# Altium footprint library PCB_IntegratedCircuit.PcbLib: 56 footprints (part 2 of 4)
Each footprint in its own frame and in the unit in brackets; x right, y up, seen from the top. Pads: shape width x height; smd on the part's side, far side on the other; paste and mask are expansions set on the pad; w line width, h text height; cw(c..) or ccw(c..) is an arc to the next point about the centre after c.
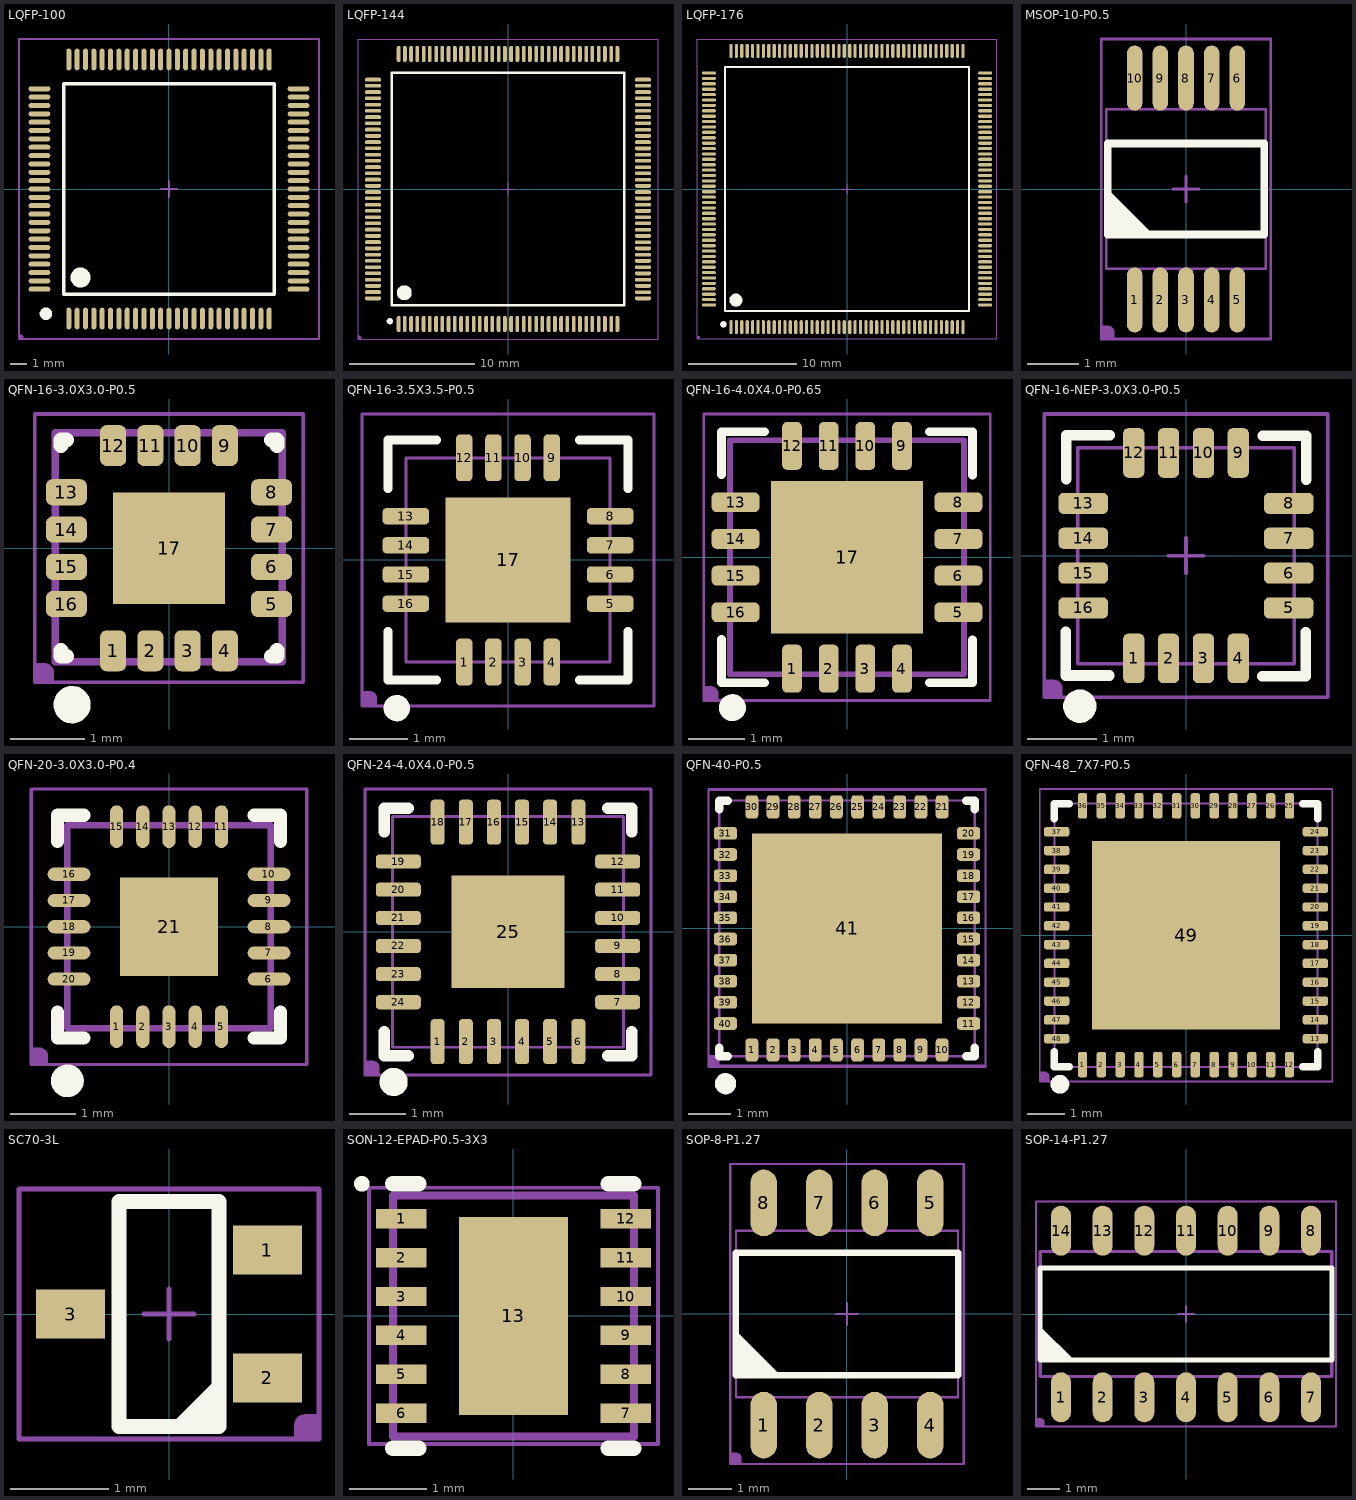
[diagram p1: the footprints below, top view; thin cyan lines are the x and y axes]

## LQFP-100 [mm]
height 1.6
pads (100):
  oval 0.3x1.3 smd: 1(-6,-7.754) 2(-5.5,-7.754) 3(-5,-7.754) 4(-4.5,-7.754) 5(-4,-7.754) 6(-3.5,-7.754) 7(-3,-7.754) 8(-2.5,-7.754) 9(-2,-7.754) 10(-1.5,-7.754) 11(-1,-7.754) 12(-0.5,-7.754) 13(0,-7.754) 14(0.5,-7.754) 15(1,-7.754) 16(1.5,-7.754) 17(2,-7.754) 18(2.5,-7.754) 19(3,-7.754) 20(3.5,-7.754) 21(4,-7.754) 22(4.5,-7.754) 23(5,-7.754) 24(5.5,-7.754) 25(6,-7.754) 51(6,7.754) 52(5.5,7.754) 53(5,7.754) 54(4.5,7.754) 55(4,7.754) 56(3.5,7.754) 57(3,7.754) 58(2.5,7.754) 59(2,7.754) 60(1.5,7.754) 61(1,7.754) 62(0.5,7.754) 63(0,7.754) 64(-0.5,7.754) 65(-1,7.754) 66(-1.5,7.754) 67(-2,7.754) 68(-2.5,7.754) 69(-3,7.754) 70(-3.5,7.754) 71(-4,7.754) 72(-4.5,7.754) 73(-5,7.754) 74(-5.5,7.754) 75(-6,7.754)
  oval 1.3x0.3 smd: 26(7.754,-6) 27(7.754,-5.5) 28(7.754,-5) 29(7.754,-4.5) 30(7.754,-4) 31(7.754,-3.5) 32(7.754,-3) 33(7.754,-2.5) 34(7.754,-2) 35(7.754,-1.5) 36(7.754,-1) 37(7.754,-0.5) 38(7.754,0) 39(7.754,0.5) 40(7.754,1) 41(7.754,1.5) 42(7.754,2) 43(7.754,2.5) 44(7.754,3) 45(7.754,3.5) 46(7.754,4) 47(7.754,4.5) 48(7.754,5) 49(7.754,5.5) 50(7.754,6) 76(-7.754,6) 77(-7.754,5.5) 78(-7.754,5) 79(-7.754,4.5) 80(-7.754,4) 81(-7.754,3.5) 82(-7.754,3) 83(-7.754,2.5) 84(-7.754,2) 85(-7.754,1.5) 86(-7.754,1) 87(-7.754,0.5) 88(-7.754,0) 89(-7.754,-0.5) 90(-7.754,-1) 91(-7.754,-1.5) 92(-7.754,-2) 93(-7.754,-2.5) 94(-7.754,-3) 95(-7.754,-3.5) 96(-7.754,-4) 97(-7.754,-4.5) 98(-7.754,-5) 99(-7.754,-5.5) 100(-7.754,-6)
Top Overlay:
  circle w0.5: c-7.364,-7.468 r0.125
  circle w0.6: c-5.3,-5.3 r0.3
  lines w0.2: -6.3,-6.3 6.3,-6.3 6.3,6.3 -6.3,6.3 -6.3,-6.3
Top Assembly (Mech13):
  lines w0.1: -0.5,0 0.5,0 ; 0,-0.5 0,0.5
Top Component:
  region: -8.979,-8.979 -8.979,-8.725 -8.852,-8.725 -8.827,-8.725 -8.78,-8.745 -8.745,-8.78 -8.725,-8.827 -8.725,-8.852 -8.725,-8.979
  lines w0.1: -8.979,-8.979 -8.979,8.979 8.979,8.979 8.979,-8.979 -8.979,-8.979
  text ".Designator" at -1.041,-0.61 h2.54
3D body "LQFP_100.STEP": height 1.72, standoff -0.03, extent -7.998,-7.999 7.999,7.999

## LQFP-144 [mm]
height 1.6
pads (144):
  oval 0.3x1.3 smd: 1(-8.75,-10.8) 2(-8.25,-10.8) 3(-7.75,-10.8) 4(-7.25,-10.8) 5(-6.75,-10.8) 6(-6.25,-10.8) 7(-5.75,-10.8) 8(-5.25,-10.8) 9(-4.75,-10.8) 10(-4.25,-10.8) 11(-3.75,-10.8) 12(-3.25,-10.8) 13(-2.75,-10.8) 14(-2.25,-10.8) 15(-1.75,-10.8) 16(-1.25,-10.8) 17(-0.75,-10.8) 18(-0.25,-10.8) 19(0.25,-10.8) 20(0.75,-10.8) 21(1.25,-10.8) 22(1.75,-10.8) 23(2.25,-10.8) 24(2.75,-10.8) 25(3.25,-10.8) 26(3.75,-10.8) 27(4.25,-10.8) 28(4.75,-10.8) 29(5.25,-10.8) 30(5.75,-10.8) 31(6.25,-10.8) 32(6.75,-10.8) 33(7.25,-10.8) 34(7.75,-10.8) 35(8.25,-10.8) 36(8.75,-10.8) 73(8.75,10.8) 74(8.25,10.8) 75(7.75,10.8) 76(7.25,10.8) 77(6.75,10.8) 78(6.25,10.8) 79(5.75,10.8) 80(5.25,10.8) 81(4.75,10.8) 82(4.25,10.8) 83(3.75,10.8) 84(3.25,10.8) 85(2.75,10.8) 86(2.25,10.8) 87(1.75,10.8) 88(1.25,10.8) 89(0.75,10.8) 90(0.25,10.8) 91(-0.25,10.8) 92(-0.75,10.8) 93(-1.25,10.8) 94(-1.75,10.8) 95(-2.25,10.8) 96(-2.75,10.8) 97(-3.25,10.8) 98(-3.75,10.8) 99(-4.25,10.8) 100(-4.75,10.8) 101(-5.25,10.8) 102(-5.75,10.8) 103(-6.25,10.8) 104(-6.75,10.8) 105(-7.25,10.8) 106(-7.75,10.8) 107(-8.25,10.8) 108(-8.75,10.8)
  oval 1.3x0.3 smd: 37(10.8,-8.75) 38(10.8,-8.25) 39(10.8,-7.75) 40(10.8,-7.25) 41(10.8,-6.75) 42(10.8,-6.25) 43(10.8,-5.75) 44(10.8,-5.25) 45(10.8,-4.75) 46(10.8,-4.25) 47(10.8,-3.75) 48(10.8,-3.25) 49(10.8,-2.75) 50(10.8,-2.25) 51(10.8,-1.75) 52(10.8,-1.25) 53(10.8,-0.75) 54(10.8,-0.25) 55(10.8,0.25) 56(10.8,0.75) 57(10.8,1.25) 58(10.8,1.75) 59(10.8,2.25) 60(10.8,2.75) 61(10.8,3.25) 62(10.8,3.75) 63(10.8,4.25) 64(10.8,4.75) 65(10.8,5.25) 66(10.8,5.75) 67(10.8,6.25) 68(10.8,6.75) 69(10.8,7.25) 70(10.8,7.75) 71(10.8,8.25) 72(10.8,8.75) 109(-10.8,8.75) 110(-10.8,8.25) 111(-10.8,7.75) 112(-10.8,7.25) 113(-10.8,6.75) 114(-10.8,6.25) 115(-10.8,5.75) 116(-10.8,5.25) 117(-10.8,4.75) 118(-10.8,4.25) 119(-10.8,3.75) 120(-10.8,3.25) 121(-10.8,2.75) 122(-10.8,2.25) 123(-10.8,1.75) 124(-10.8,1.25) 125(-10.8,0.75) 126(-10.8,0.25) 127(-10.8,-0.25) 128(-10.8,-0.75) 129(-10.8,-1.25) 130(-10.8,-1.75) 131(-10.8,-2.25) 132(-10.8,-2.75) 133(-10.8,-3.25) 134(-10.8,-3.75) 135(-10.8,-4.25) 136(-10.8,-4.75) 137(-10.8,-5.25) 138(-10.8,-5.75) 139(-10.8,-6.25) 140(-10.8,-6.75) 141(-10.8,-7.25) 142(-10.8,-7.75) 143(-10.8,-8.25) 144(-10.8,-8.75)
Top Overlay:
  circle w0.6: c-8.3,-8.3 r0.3
  circle w0.25: c-9.45,-10.575 r0.13
  lines w0.2: -9.3,-9.3 -9.3,9.3 9.3,9.3 9.3,-9.3 -9.3,-9.3
Top Assembly (Mech13):
  lines w0.1: -0.5,0 0.5,0 ; 0,-0.5 0,0.5
Top Component:
  region: -12,-12 -12,-11.746 -11.873,-11.746 -11.848,-11.746 -11.801,-11.765 -11.765,-11.801 -11.746,-11.848 -11.746,-11.873 -11.746,-12
  lines w0.1: -12,-12 12,-12 12,12 -12,12 -12,-12
  text ".Designator" at -1.041,-0.61 h2.54
3D body "LQFP_144.STEP": height 1.55, standoff 0, extent -11.003,-11.003 11.003,11.003

## LQFP-176 [mm]
height 1.6
pads (176):
  oval 0.3x1.3 smd: 1(-10.75,-12.804) 2(-10.25,-12.804) 3(-9.75,-12.804) 4(-9.25,-12.804) 5(-8.75,-12.804) 6(-8.25,-12.804) 7(-7.75,-12.804) 8(-7.25,-12.804) 9(-6.75,-12.804) 10(-6.25,-12.804) 11(-5.75,-12.804) 12(-5.25,-12.804) 13(-4.75,-12.804) 14(-4.25,-12.804) 15(-3.75,-12.804) 16(-3.25,-12.804) 17(-2.75,-12.804) 18(-2.25,-12.804) 19(-1.75,-12.804) 20(-1.25,-12.804) 21(-0.75,-12.804) 22(-0.25,-12.804) 23(0.25,-12.804) 24(0.75,-12.804) 25(1.25,-12.804) 26(1.75,-12.804) 27(2.25,-12.804) 28(2.75,-12.804) 29(3.25,-12.804) 30(3.75,-12.804) 31(4.25,-12.804) 32(4.75,-12.804) 33(5.25,-12.804) 34(5.75,-12.804) 35(6.25,-12.804) 36(6.75,-12.804) 37(7.25,-12.804) 38(7.75,-12.804) 39(8.25,-12.804) 40(8.75,-12.804) 41(9.25,-12.804) 42(9.75,-12.804) 43(10.25,-12.804) 44(10.75,-12.804) 89(10.75,12.804) 90(10.25,12.804) 91(9.75,12.804) 92(9.25,12.804) 93(8.75,12.804) 94(8.25,12.804) 95(7.75,12.804) 96(7.25,12.804) 97(6.75,12.804) 98(6.25,12.804) 99(5.75,12.804) 100(5.25,12.804) 101(4.75,12.804) 102(4.25,12.804) 103(3.75,12.804) 104(3.25,12.804) 105(2.75,12.804) 106(2.25,12.804) 107(1.75,12.804) 108(1.25,12.804) 109(0.75,12.804) 110(0.25,12.804) 111(-0.25,12.804) 112(-0.75,12.804) 113(-1.25,12.804) 114(-1.75,12.804) 115(-2.25,12.804) 116(-2.75,12.804) 117(-3.25,12.804) 118(-3.75,12.804) 119(-4.25,12.804) 120(-4.75,12.804) 121(-5.25,12.804) 122(-5.75,12.804) 123(-6.25,12.804) 124(-6.75,12.804) 125(-7.25,12.804) 126(-7.75,12.804) 127(-8.25,12.804) 128(-8.75,12.804) 129(-9.25,12.804) 130(-9.75,12.804) 131(-10.25,12.804) 132(-10.75,12.804)
  oval 1.3x0.3 smd: 45(12.804,-10.75) 46(12.804,-10.25) 47(12.804,-9.75) 48(12.804,-9.25) 49(12.804,-8.75) 50(12.804,-8.25) 51(12.804,-7.75) 52(12.804,-7.25) 53(12.804,-6.75) 54(12.804,-6.25) 55(12.804,-5.75) 56(12.804,-5.25) 57(12.804,-4.75) 58(12.804,-4.25) 59(12.804,-3.75) 60(12.804,-3.25) 61(12.804,-2.75) 62(12.804,-2.25) 63(12.804,-1.75) 64(12.804,-1.25) 65(12.804,-0.75) 66(12.804,-0.25) 67(12.804,0.25) 68(12.804,0.75) 69(12.804,1.25) 70(12.804,1.75) 71(12.804,2.25) 72(12.804,2.75) 73(12.804,3.25) 74(12.804,3.75) 75(12.804,4.25) 76(12.804,4.75) 77(12.804,5.25) 78(12.804,5.75) 79(12.804,6.25) 80(12.804,6.75) 81(12.804,7.25) 82(12.804,7.75) 83(12.804,8.25) 84(12.804,8.75) 85(12.804,9.25) 86(12.804,9.75) 87(12.804,10.25) 88(12.804,10.75) 133(-12.804,10.75) 134(-12.804,10.25) 135(-12.804,9.75) 136(-12.804,9.25) 137(-12.804,8.75) 138(-12.804,8.25) 139(-12.804,7.75) 140(-12.804,7.25) 141(-12.804,6.75) 142(-12.804,6.25) 143(-12.804,5.75) 144(-12.804,5.25) 145(-12.804,4.75) 146(-12.804,4.25) 147(-12.804,3.75) 148(-12.804,3.25) 149(-12.804,2.75) 150(-12.804,2.25) 151(-12.804,1.75) 152(-12.804,1.25) 153(-12.804,0.75) 154(-12.804,0.25) 155(-12.804,-0.25) 156(-12.804,-0.75) 157(-12.804,-1.25) 158(-12.804,-1.75) 159(-12.804,-2.25) 160(-12.804,-2.75) 161(-12.804,-3.25) 162(-12.804,-3.75) 163(-12.804,-4.25) 164(-12.804,-4.75) 165(-12.804,-5.25) 166(-12.804,-5.75) 167(-12.804,-6.25) 168(-12.804,-6.75) 169(-12.804,-7.25) 170(-12.804,-7.75) 171(-12.804,-8.25) 172(-12.804,-8.75) 173(-12.804,-9.25) 174(-12.804,-9.75) 175(-12.804,-10.25) 176(-12.804,-10.75)
Top Overlay:
  circle w0.6: c-10.3,-10.3 r0.3
  circle w0.3: c-11.45,-12.55 r0.15
  lines w0.2: -11.3,-11.3 -11.3,11.3 11.3,11.3 11.3,-11.3 -11.3,-11.3
Top Assembly (Mech13):
  lines w0.1: -0.5,0 0.5,0 ; 0,-0.5 0,0.5
Top Component:
  region: -13.904,-13.904 -13.904,-13.65 -13.777,-13.65 -13.752,-13.65 -13.705,-13.669 -13.669,-13.705 -13.65,-13.752 -13.65,-13.777 -13.65,-13.904
  lines w0.1: -13.904,-13.904 13.904,-13.904 13.904,13.904 -13.904,13.904 -13.904,-13.904
  text ".Designator" at -1.041,-0.61 h2.54
3D body "LQFP_176.STEP": height 1.5, standoff 0, extent -13.002,-13.002 13.003,13.003

## MSOP-10-P0.5 [mil]
height 43.31
pads (10):
  oval 12x50 smd: 1(-39.37,-85) 2(-19.69,-85) 3(0,-85) 4(19.68,-85) 5(39.37,-85) 6(39.37,85) 7(19.68,85) 8(0,85) 9(-19.69,85) 10(-39.37,85)
Top Overlay:
  region: -60,-35 -60,0 -25,-35
  lines w6: -60,-35 60,-35 60,35 -60,35 -60,-35
Top Assembly (Mech13):
  lines w2: -10,0 10,0 ; 0,-10 0,10 ; -61.02,-61.02 -61.02,61.02 61.02,61.02 61.02,-61.02 -61.02,-61.02
Top Component:
  region: -65,-115 -65,-105 -60,-105 -59.01,-105 -57.17,-105.76 -55.76,-107.17 -55,-109.01 -55,-110 -55,-115
  lines w2: -65,-115 65,-115 65,115 -65,115 -65,-115
  text ".Designator" at -41,-25 h100
3D body "User Library-msop-10.STEP": height 45.28, standoff 0, extent -59.06,-96.45 59.05,96.46

## QFN-16-3.0X3.0-P0.5 [mm] "PQFN, 16-Leads, Body 3.00x3.00mm, Pitch 0.50mm, Thermal Pad 1.50x1.50mm, IPC Medium Density"
height 0.8
pads (17):
  rrect50% 0.35x0.55 smd: 1(-0.75,-1.377) 2(-0.25,-1.377) 3(0.25,-1.377) 4(0.75,-1.377) 9(0.75,1.377) 10(0.25,1.377) 11(-0.25,1.377) 12(-0.75,1.377)
  rrect50% 0.55x0.35 smd: 5(1.377,-0.75) 6(1.377,-0.25) 7(1.377,0.25) 8(1.377,0.75) 13(-1.377,0.75) 14(-1.377,0.25) 15(-1.377,-0.25) 16(-1.377,-0.75)
  rect 1.5x1.5 smd: 17(0,0)
Top Overlay:
  circle w0.25: c-1.3,-2.1 r0.125
  lines w0.2: -1.45,-1.375 -1.45,-1.45 -1.375,-1.45 ; -1.45,1.375 -1.45,1.45 -1.375,1.45 ; 1.375,-1.45 1.45,-1.45 1.45,-1.375 ; 1.375,1.45 1.45,1.45 1.45,1.375
Top Assembly (Mech13):
  lines w0.1: -0.5,0 0.5,0 ; 0,-0.5 0,0.5 ; -1.524,-1.524 -1.524,1.549 1.521,1.549 1.521,-1.524 -1.524,-1.524
Top Component:
  region: -1.8,-1.8 -1.8,-1.546 -1.673,-1.546 -1.648,-1.546 -1.601,-1.565 -1.565,-1.601 -1.546,-1.648 -1.546,-1.673 -1.546,-1.8
  lines w0.05: -1.8,-1.8 1.8,-1.8 1.8,1.8 -1.8,1.8 -1.8,-1.8
  text ".Designator" at -0.813,-0.533 h2.03
3D body "ALSRobot-QFN16 3x3.STEP": height 0.9, standoff 0, extent -1.521,-1.524 1.521,1.518

## QFN-16-3.5X3.5-P0.5 [mm]
pads (17):
  rrect50% 0.28x0.8 smd: 1(-0.75,-1.75) 2(-0.25,-1.75) 3(0.25,-1.75) 4(0.75,-1.75) 9(0.75,1.75) 10(0.25,1.75) 11(-0.25,1.75) 12(-0.75,1.75)
  rrect50% 0.8x0.28 smd: 5(1.75,-0.75) 6(1.75,-0.25) 7(1.75,0.25) 8(1.75,0.75) 13(-1.75,0.75) 14(-1.75,0.25) 15(-1.75,-0.25) 16(-1.75,-0.75)
  rect 2.14x2.14 smd: 17(0,0)
Top Overlay:
  circle w0.25: c-1.905,-2.54 r0.1
  lines w0.152: -2.057,-1.223 -2.057,-2.057 -1.223,-2.057 ; -2.057,1.223 -2.057,2.057 -1.223,2.057 ; 1.223,-2.057 2.057,-2.057 2.057,-1.223 ; 1.223,2.057 2.057,2.057 2.057,1.223
Top Assembly (Mech13):
  lines w0.051: -0.127,0 0.127,0 ; 0,-0.127 0,0.127 ; -1.75,-1.75 -1.75,1.75 1.75,1.75 1.75,-1.75 -1.75,-1.75
Top Component:
  region: -2.5,-2.5 -2.5,-2.246 -2.373,-2.246 -2.348,-2.246 -2.301,-2.265 -2.265,-2.301 -2.246,-2.348 -2.246,-2.373 -2.246,-2.5
  lines w0.051: -2.5,-2.5 -2.5,2.5 2.5,2.5 2.5,-2.5 -2.5,-2.5
  text ".Designator" at -1.041,-0.508 h2.03
3D body "RVA0016A.stp": height 1, standoff 0, extent -1.75,-1.75 1.75,1.75

## QFN-16-4.0X4.0-P0.65 [mm]
height 1.5
pads (17):
  rrect50% 0.35x0.85 smd: 1(-0.975,-1.975) 2(-0.325,-1.975) 3(0.325,-1.975) 4(0.975,-1.975) 9(0.975,1.975) 10(0.325,1.975) 11(-0.325,1.975) 12(-0.975,1.975)
  rrect50% 0.85x0.35 smd: 5(1.975,-0.975) 6(1.975,-0.325) 7(1.975,0.325) 8(1.975,0.975) 13(-1.975,0.975) 14(-1.975,0.325) 15(-1.975,-0.325) 16(-1.975,-0.975)
  rect 2.7x2.7 smd: 17(0,0)
Top Overlay:
  circle w0.254: c-2.032,-2.667 r0.112
  lines w0.152: -2.225,-1.458 -2.225,-2.225 -1.463,-2.225 ; -2.225,1.463 -2.225,2.225 -1.458,2.225 ; 1.458,-2.225 2.225,-2.225 2.225,-1.463 ; 1.463,2.225 2.225,2.225 2.225,1.458
Top Assembly (Mech13):
  lines w0.051: -0.254,0 0.254,0 ; 0,-0.254 0,0.254
  lines w0.1: -2.075,-2.075 -2.075,2.075 2.075,2.075 2.075,-2.075 -2.075,-2.075
Top Component:
  region: -2.54,-2.54 -2.54,-2.286 -2.413,-2.286 -2.388,-2.286 -2.341,-2.305 -2.305,-2.341 -2.286,-2.388 -2.286,-2.413 -2.286,-2.54
  lines w0.051: -2.54,-2.54 -2.54,2.54 2.54,2.54 2.54,-2.54 -2.54,-2.54
  text ".Designator" at -1.041,-0.635 h2.54
3D body "User Library-qfn16-4x4with pad.STEP": height 0.92, standoff 0, extent -2,-2 2,2

## QFN-16-NEP-3.0X3.0-P0.5 [mil]
height 23.62
pads (16):
  rrect50% 12x28 smd: 1(-29.53,-58) 2(-9.84,-58) 3(9.84,-58) 4(29.53,-58) 9(29.53,58) 10(9.84,58) 11(-9.84,58) 12(-29.53,58)
  rrect50% 28x12 smd: 5(58,-29.53) 6(58,-9.84) 7(58,9.84) 8(58,29.53) 13(-58,29.53) 14(-58,9.84) 15(-58,-9.84) 16(-58,-29.53)
Top Overlay:
  circle w10: c-60,-85 r4.4
  lines w6: -68,-43 -68,-67.67 -43.33,-67.67 ; -67.67,43.33 -67.67,68 -43,68 ; 43,-68 67.67,-68 67.67,-43.33 ; 43.33,67.67 68,67.67 68,43
Top Assembly (Mech13):
  lines w2: -10,0 10,0 ; 0,-10 0,10 ; -61.02,-61.02 61.02,-61.02 61.02,61.02 -61.02,61.02 -61.02,-61.02
Top Component:
  region: -80,-80 -80,-70 -75,-70 -74.01,-70 -72.17,-70.76 -70.76,-72.17 -70,-74.01 -70,-75 -70,-80
  lines w2: -80,-80 -80,80 80,80 80,-80 -80,-80
  text ".Designator" at -41,-20 h80
3D body "QFN50P300X300X100-16N.step": height 39.37, standoff 0, extent -59.06,-59.05 59.05,59.06

## QFN-20-3.0X3.0-P0.4 [mm] "QFN, 20-Leads, Body 3.00x3.00mm, Pitch 0.40mm, Thermal Pad 1.50x1.50mm, IPC Medium Density"
height 0.8
pads (21):
  oval 0.2x0.65 smd: 1(-0.8,-1.525) 2(-0.4,-1.525) 3(0,-1.525) 4(0.4,-1.525) 5(0.8,-1.525) 11(0.8,1.525) 12(0.4,1.525) 13(0,1.525) 14(-0.4,1.525) 15(-0.8,1.525)
  oval 0.65x0.2 smd: 6(1.525,-0.8) 7(1.525,-0.4) 8(1.525,0) 9(1.525,0.4) 10(1.525,0.8) 16(-1.525,0.8) 17(-1.525,0.4) 18(-1.525,0) 19(-1.525,-0.4) 20(-1.525,-0.8)
  rect 1.5x1.5 smd: 21(0,0)
Top Overlay:
  circle w0.25: c-1.55,-2.35 r0.125
  lines w0.2: -1.7,-1.3 -1.7,-1.7 -1.3,-1.7 ; -1.7,1.3 -1.7,1.7 -1.3,1.7 ; 1.3,-1.7 1.7,-1.7 1.7,-1.3 ; 1.3,1.7 1.7,1.7 1.7,1.3
Top Assembly (Mech13):
  lines w0.051: -0.254,0 0.254,0 ; 0,-0.254 0,0.254
  lines w0.1: -1.55,-1.55 -1.55,1.55 1.55,1.55 1.55,-1.55 -1.55,-1.55
Top Component:
  region: -2.1,-2.1 -2.1,-1.846 -1.973,-1.846 -1.948,-1.846 -1.901,-1.865 -1.865,-1.901 -1.846,-1.948 -1.846,-1.973 -1.846,-2.1
  lines w0.05: -2.1,-2.1 -2.1,2.1 2.1,2.1 2.1,-2.1 -2.1,-2.1
  text ".Designator" at -1.041,-0.508 h2.03
3D body: height 0.8, standoff 0, extent -1.55,-1.55 1.55,1.55

## QFN-24-4.0X4.0-P0.5 [mm] "QFN, 24-Leads, Body 4.00x4.00mm, Pitch 0.50mm, Thermal Pad 2.70x2.60mm, IPC Medium Density"
height 0.9
pads (25):
  rrect50% 0.25x0.8 smd: 1(-1.25,-1.95) 2(-0.75,-1.95) 3(-0.25,-1.95) 4(0.25,-1.95) 5(0.75,-1.95) 6(1.25,-1.95) 13(1.25,1.95) 14(0.75,1.95) 15(0.25,1.95) 16(-0.25,1.95) 17(-0.75,1.95) 18(-1.25,1.95)
  rrect50% 0.8x0.25 smd: 7(1.95,-1.25) 8(1.95,-0.75) 9(1.95,-0.25) 10(1.95,0.25) 11(1.95,0.75) 12(1.95,1.25) 19(-1.95,1.25) 20(-1.95,0.75) 21(-1.95,0.25) 22(-1.95,-0.25) 23(-1.95,-0.75) 24(-1.95,-1.25)
  rect 2x2 smd: 25(0,0)
Top Overlay:
  circle w0.25: c-2.032,-2.667 r0.125
  lines w0.2: -2.2,-1.775 -2.2,-2.2 -1.775,-2.2 ; -2.2,1.775 -2.2,2.2 -1.775,2.2 ; 1.775,-2.2 2.2,-2.2 2.2,-1.775 ; 1.775,2.2 2.2,2.2 2.2,1.775
Top Assembly (Mech13):
  lines w0.051: -2.05,-2.05 -2.05,2.05 2.05,2.05 2.05,-2.05 -2.05,-2.05
Top Component:
  region: -2.54,-2.54 -2.54,-2.286 -2.413,-2.286 -2.388,-2.286 -2.341,-2.305 -2.305,-2.341 -2.286,-2.388 -2.286,-2.413 -2.286,-2.54
  lines w0.051: -2.54,-2.54 -2.54,2.54 2.54,2.54 2.54,-2.54 -2.54,-2.54
  text ".Designator" at -1.041,-0.508 h2.03
3D body "QFN-24.step": height 0.9, standoff 0, extent -2.07,-2.07 2.07,2.07

## QFN-40-P0.5 [mm] "PQFN, 40-Leads, Body 5.98x5.98mm, Pitch 0.50mm, Thermal Pad 4.62x4.62mm, IPC Medium Density"
height 0.9
pads (41):
  rrect50% 0.3x0.55 smd: 1(-2.25,-2.877) 2(-1.75,-2.877) 3(-1.25,-2.877) 4(-0.75,-2.877) 5(-0.25,-2.877) 6(0.25,-2.877) 7(0.75,-2.877) 8(1.25,-2.877) 9(1.75,-2.877) 10(2.25,-2.877) 21(2.25,2.877) 22(1.75,2.877) 23(1.25,2.877) 24(0.75,2.877) 25(0.25,2.877) 26(-0.25,2.877) 27(-0.75,2.877) 28(-1.25,2.877) 29(-1.75,2.877) 30(-2.25,2.877)
  rrect50% 0.55x0.3 smd: 11(2.877,-2.25) 12(2.877,-1.75) 13(2.877,-1.25) 14(2.877,-0.75) 15(2.877,-0.25) 16(2.877,0.25) 17(2.877,0.75) 18(2.877,1.25) 19(2.877,1.75) 20(2.877,2.25) 31(-2.877,2.25) 32(-2.877,1.75) 33(-2.877,1.25) 34(-2.877,0.75) 35(-2.877,0.25) 36(-2.877,-0.25) 37(-2.877,-0.75) 38(-2.877,-1.25) 39(-2.877,-1.75) 40(-2.877,-2.25)
  rect 4.5x4.5 smd: 41(0,0)
Top Overlay:
  circle w0.25: c-2.875,-3.675 r0.125
  lines w0.2: -3.025,-2.825 -3.025,-3.025 -2.825,-3.025 ; -3.025,2.825 -3.025,3.025 -2.825,3.025 ; 2.825,-3.025 3.025,-3.025 3.025,-2.825 ; 2.825,3.025 3.025,3.025 3.025,2.825
Top Assembly (Mech13):
  lines w0.051: -0.254,0 0.254,0 ; 0,-0.254 0,0.254 ; -3.025,-3.025 3.025,-3.025 3.025,3.025 -3.025,3.025 -3.025,-3.025
Top Component:
  region: -3.275,-3.25 -3.275,-2.996 -3.148,-2.996 -3.123,-2.996 -3.076,-3.015 -3.04,-3.051 -3.021,-3.097 -3.021,-3.123 -3.021,-3.25
  region: -3.275,-3.275 -3.275,-3.021 -3.148,-3.021 -3.123,-3.021 -3.076,-3.04 -3.04,-3.076 -3.021,-3.123 -3.021,-3.148 -3.021,-3.275
  lines w0.05: -3.275,-3.275 -3.275,3.275 3.275,3.275 3.275,-3.275 -3.275,-3.275 ; -3.275,-3.25 3.275,-3.25 3.275,3.3 -3.275,3.3 -3.275,-3.25
  text ".Designator" at -1.041,-0.508 h2.03
3D body "QFN40-1.STEP": height 0.9, standoff 0, extent -3,-3 3,3

## QFN-48_7X7-P0.5 [mm]
pads (49):
  rrect50% 0.25x0.675 smd: 1(-2.75,-3.439) 2(-2.25,-3.439) 3(-1.75,-3.439) 4(-1.25,-3.439) 5(-0.75,-3.439) 6(-0.25,-3.439) 7(0.25,-3.439) 8(0.75,-3.439) 9(1.25,-3.439) 10(1.75,-3.439) 11(2.25,-3.439) 12(2.75,-3.439) 25(2.75,3.439) 26(2.25,3.439) 27(1.75,3.439) 28(1.25,3.439) 29(0.75,3.439) 30(0.25,3.439) 31(-0.25,3.439) 32(-0.75,3.439) 33(-1.25,3.439) 34(-1.75,3.439) 35(-2.25,3.439) 36(-2.75,3.439)
  rrect50% 0.675x0.25 smd: 13(3.439,-2.75) 14(3.439,-2.25) 15(3.439,-1.75) 16(3.439,-1.25) 17(3.439,-0.75) 18(3.439,-0.25) 19(3.439,0.25) 20(3.439,0.75) 21(3.439,1.25) 22(3.439,1.75) 23(3.439,2.25) 24(3.439,2.75) 37(-3.439,2.75) 38(-3.439,2.25) 39(-3.439,1.75) 40(-3.439,1.25) 41(-3.439,0.75) 42(-3.439,0.25) 43(-3.439,-0.25) 44(-3.439,-0.75) 45(-3.439,-1.25) 46(-3.439,-1.75) 47(-3.439,-2.25) 48(-3.439,-2.75)
  rect 5x5 smd: 49(0,0)
Top Overlay:
  circle w0.25: c-3.353,-3.962 r0.125
  lines w0.2: -3.5,-3.1 -3.5,-3.5 -3.1,-3.5 ; -3.5,3.1 -3.5,3.5 -3.1,3.5 ; 3.1,-3.5 3.5,-3.5 3.5,-3.1 ; 3.1,3.5 3.5,3.5 3.5,3.1
Top Assembly (Mech13):
  lines w0.051: -0.254,0 0.254,0 ; 0,-0.254 0,0.254 ; -3.5,-3.5 -3.5,3.5 3.5,3.5 3.5,-3.5 -3.5,-3.5
Top Component:
  region: -3.886,-3.886 -3.886,-3.632 -3.759,-3.632 -3.734,-3.632 -3.687,-3.652 -3.652,-3.687 -3.632,-3.734 -3.632,-3.759 -3.632,-3.886
  lines w0.05: -3.886,-3.886 -3.886,3.886 3.886,3.886 3.886,-3.886 -3.886,-3.886
  text ".Designator" at -1.016,-0.533 h2.03
3D body: height 1, standoff 0.05, extent -3.5,-3.5 3.5,3.5

## SC70-3L [mm]
pads (3):
  rect 0.7x0.5 smd: 1(1,0.65) 2(1,-0.65) 3(-1,0)
Top Overlay:
  region: 0.508,-1.143 0,-1.143 0.508,-0.635
  lines w0.152: -0.508,-1.143 0.508,-1.143 0.508,1.143 -0.508,1.143 -0.508,-1.143
Top Assembly (Mech13):
  lines w0.051: -0.254,0 0.254,0 ; 0,-0.254 0,0.254
Top Component:
  region: 1.524,-1.27 1.27,-1.27 1.27,-1.143 1.27,-1.118 1.289,-1.071 1.325,-1.035 1.372,-1.016 1.397,-1.016 1.524,-1.016
  lines w0.051: -1.524,-1.27 1.524,-1.27 1.524,1.27 -1.524,1.27 -1.524,-1.27
  text ".Designator" at -0.762,-0.508 h2.03
3D body "User Library-SOT323 (SC70-3)-1.STEP": height 1.1, standoff 0, extent -1.123,-1.1 1.123,1.1

## SON-12-EPAD-P0.5-3X3 [mm] "SON, 12-Leads, Body 3.03x3.03mm, Pitch 0.50mm, Thermal Pad 2.55x1.40mm, IPC High Density"
height 0.6
pads (13):
  rect 0.65x0.25 smd: 1(-1.445,1.25) 2(-1.445,0.75) 3(-1.445,0.25) 4(-1.445,-0.25) 5(-1.445,-0.75) 6(-1.445,-1.25) 7(1.445,-1.25) 8(1.445,-0.75) 9(1.445,-0.25) 10(1.445,0.25) 11(1.445,0.75) 12(1.445,1.25)
  rect 1.4x2.55 smd: 13(0,0)
Top Overlay:
  circle w0.1: c-1.95,1.7 r0.05
  lines w0.2: -1.55,-1.7 -1.22,-1.7 ; -1.55,1.7 -1.22,1.7 ; 1.22,-1.7 1.55,-1.7 ; 1.22,1.7 1.55,1.7
Top Assembly (Mech13):
  lines w0.1: -0.5,0 0.5,0 ; 0,-0.5 0,0.5 ; -1.55,-1.55 -1.55,1.55 1.55,1.55 1.55,-1.55 -1.55,-1.55
Top Component:
  lines w0.05: -1.86,-1.65 1.86,-1.65 1.86,1.65 -1.86,1.65 -1.86,-1.65
3D body: height 0.6, standoff 0, extent -1.55,-1.55 1.55,1.55

## SOP-8-P1.27 [mil]
pads (8):
  oval 24x60 smd: 1(-75,-100.02) 2(-25,-100.02) 3(25,-100.02) 4(75,-100.02) 5(75,99.98) 6(25,99.98) 7(-25,99.98) 8(-75,99.98)
Top Overlay:
  region: -100,-55.02 -100,-15.02 -60,-55.02
  lines w6: -100,-55.02 -100,54.98 100,54.98 100,-55.02 -100,-55.02
Top Assembly (Mech13):
  lines w2.01: -10,-0.02 10,-0.02 ; 0,-10.02 0,9.98 ; -100,-75.02 100,-75.02 100,74.98 -100,74.98 -100,-75.02
Top Component:
  region: -105,-135.02 -105,-125.02 -100,-125.02 -99,-125.02 -97.16,-125.78 -95.76,-127.18 -95,-129.02 -95,-130.02 -95,-135.02
  lines w2: -105,-135.02 105,-135.02 105,134.98 -105,134.98 -105,-135.02
  text ".Designator" at -41,-25 h100
3D body "User Library-SOIC-8-1.STEP": height 68.9, standoff 0, extent -96.45,-118.12 96.46,118.1

## SOP-14-P1.27 [mil]
height 68.9
pads (14):
  oval 24x60 smd: 1(-150,-100) 2(-100,-100) 3(-50,-100) 4(0,-100) 5(50,-100) 6(100,-100) 7(150,-100) 8(150,100) 9(100,100) 10(50,100) 11(0,100) 12(-50,100) 13(-100,100) 14(-150,100)
Top Overlay:
  region: -175,-55 -175,-15 -135,-55
  lines w6: -175,-55 -175,55 175,55 175,-55 -175,-55
Top Assembly (Mech13):
  lines w2: -10,0 10,0 ; 0,-10 0,10
  lines w4: -175,-75 -175,75 175,75 175,-75 -175,-75
Top Component:
  region: -180,-135 -180,-125 -175,-125 -174.01,-125 -172.17,-125.76 -170.76,-127.17 -170,-129.01 -170,-130 -170,-135
  lines w2: -180,-135 -180,135 180,135 180,-135 -180,-135
  text ".Designator" at -41,-25 h100
3D body "User Library-SOIC-14.STEP": height 68.9, standoff 0, extent -172.25,-118.1 172.24,118.11